# Altium schematic symbol library TI Power Management Shunt Voltage Reference.SchLib: 1526 symbols (part 6 of 18)
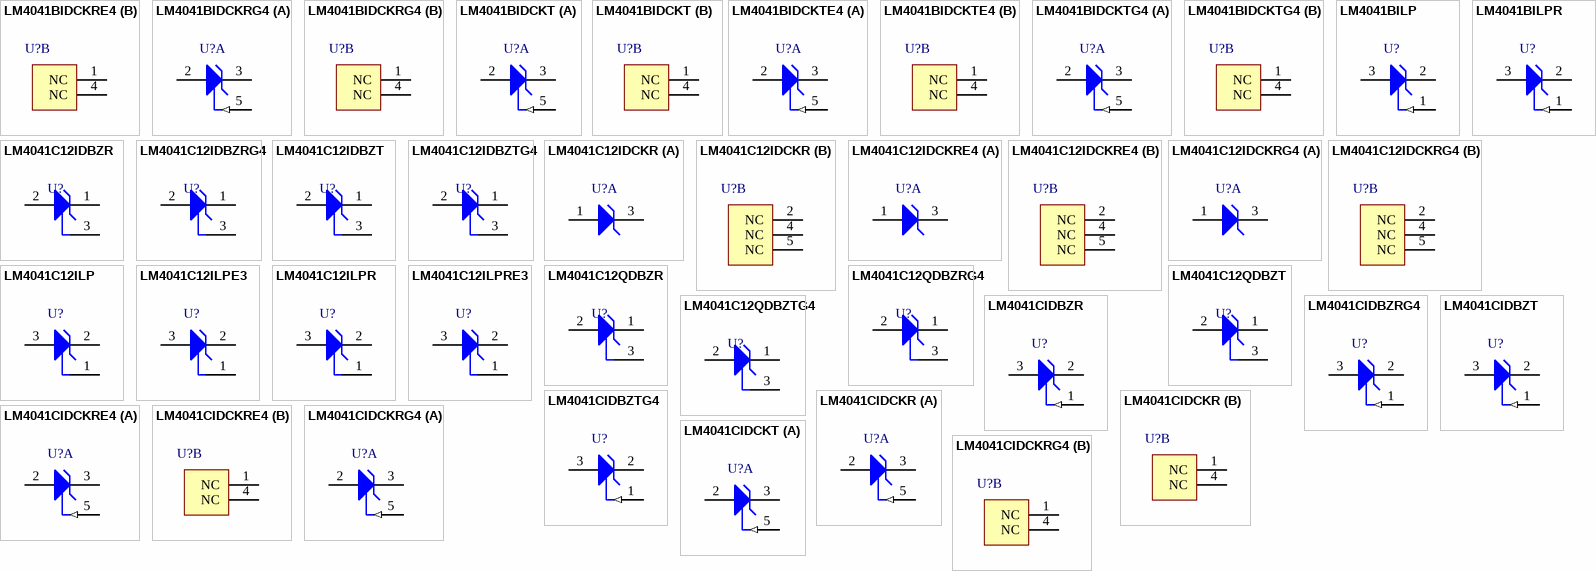
[diagram p62: symbols LM4041BIDCKRE4 to LM4041CIDCKT]

## LM4041C12IDCKRE4
designator U?
Precision Micropower Shunt Voltage Reference, 0.5% accuracy, 1.2 V, 15 ppm / degC, 12 mA, -40 to 85 degC, 5-pin SC70 (DCK), Green (RoHS & no Sb/Br); Manufacturer: Texas Instruments; PartNumber: LM4041C12IDCKRE4; Initial Accuracy @ 25/deg C(%): 0.5; Iout/Iz(Max)(mA): 12; Min Iz for Regulation(uA): 60; Rating: Catalog; Temp Coeff(Max)(ppm/ degree C): 100; Temp Coeff(Typ)(ppm/ degree C): 15; VO(V): 1.225; DatasheetVersion: SLCS146E; PackageReference: DCK5; PackageDescription: 5-Pin Plastic Small-Outline Package, 2 x 1.3 mm Body, 0.65 mm Pitch, 2.1 mm Lead Span; Supplier 1: Digi-Key; Supplier Part Number 1: LM4041C12IDCKRE4-ND; Supplier 2: Mouser; Supplier Part Number 2: 595-LM4041C12IDCKRE4; Eco-Plan: Green (RoHS & no Sb/Br); SubFamily: Shunt Voltage Reference; Mounting Technology: Surface Mount; Code_JEDEC: MO-203; ComponentLink1Description: Manufacturer URL; ComponentLink1URL: http://www.ti.com/; ComponentLink2Description: Datasheet; ComponentLink2URL: http://www.ti.com/general/docs/lit/getliterature.tsp?genericPartNumber=LM4041C12&fileType=pdf; ComponentLink3Description: Package Specification; ComponentLink3URL: http://www.ti.com/litv/pdf/mpds025f; ComponentLink4Description: URL Link1; ComponentLink4URL: Samples URL:http://www.ti.com/product/lm4041c12
footprint TI-DCK5_N (SOT353, 5-Leads, Body 2x1.3mm, Pitch 0.65mm, Lead Span 2.1mm, IPC Medium Density)
part A pins: 1 ANODE, 3 CATHODE
part B pins: 2 NC, 4 NC, 5 NC

## LM4041C12IDCKRG4
designator U?
Precision Micropower Shunt Voltage Reference, 0.5% accuracy, 1.2 V, 15 ppm / degC, 12 mA, -40 to 85 degC, 5-pin SC70 (DCK), Green (RoHS & no Sb/Br); Manufacturer: Texas Instruments; PartNumber: LM4041C12IDCKRG4; Initial Accuracy @ 25/deg C(%): 0.5; Iout/Iz(Max)(mA): 12; Min Iz for Regulation(uA): 60; Rating: Catalog; Temp Coeff(Max)(ppm/ degree C): 100; Temp Coeff(Typ)(ppm/ degree C): 15; VO(V): 1.225; DatasheetVersion: SLCS146E; PackageReference: DCK5; PackageDescription: 5-Pin Plastic Small-Outline Package, 2 x 1.3 mm Body, 0.65 mm Pitch, 2.1 mm Lead Span; Supplier 1: Digi-Key; Supplier Part Number 1: LM4041C12IDCKRG4-ND; Supplier 2: Newark; Supplier Part Number 2: 41M3460; Supplier 3: Mouser; Supplier Part Number 3: 595-LM4041C12IDCKRG4; Eco-Plan: Green (RoHS & no Sb/Br); SubFamily: Shunt Voltage Reference; Mounting Technology: Surface Mount; Code_JEDEC: MO-203; ComponentLink1Description: Manufacturer URL; ComponentLink1URL: http://www.ti.com/; ComponentLink2Description: Datasheet; ComponentLink2URL: http://www.ti.com/general/docs/lit/getliterature.tsp?genericPartNumber=LM4041C12&fileType=pdf; ComponentLink3Description: Package Specification; ComponentLink3URL: http://www.ti.com/litv/pdf/mpds025f; ComponentLink4Description: URL Link1; ComponentLink4URL: Samples URL:http://www.ti.com/product/lm4041c12
footprint TI-DCK5_N (SOT353, 5-Leads, Body 2x1.3mm, Pitch 0.65mm, Lead Span 2.1mm, IPC Medium Density)
part A pins: 1 ANODE, 3 CATHODE
part B pins: 2 NC, 4 NC, 5 NC

## LM4041C12ILP
designator U?
Precision Micropower Shunt Voltage Reference, 0.5% accuracy, 1.225 V, 15 ppm / degC, 12 mA, -40 to 85 degC, 3-pin TO-92(LP), Pb-Free (RoHS); Manufacturer: Texas Instruments; PartNumber: LM4041C12ILP; Initial Accuracy @ 25/deg C(%): 0.5; Iout/Iz(Max)(mA): 12; Min Iz for Regulation(uA): 60; Rating: Catalog; Temp Coeff(Max)(ppm/ degree C): 100; Temp Coeff(Typ)(ppm/ degree C): 15; VO(V): 1.225; DatasheetVersion: SLCS146E; PackageVersion: 4040001-2/C; PackageReference: LP3; PackageDescription: Plastic Cylindrical Package, Formed Lead Option (TO-92); Supplier 1: Digi-Key; Supplier Part Number 1: 296-31373-ND; Supplier 2: Newark; Supplier Part Number 2: 18M2429; Supplier 3: Mouser; Supplier Part Number 3: 595-LM4041C12ILP; Eco-Plan: Pb-Free (RoHS); SubFamily: Shunt Voltage Reference; Mounting Technology: Through Hole; Code_JEDEC: TO-226; ComponentLink1Description: Manufacturer URL; ComponentLink1URL: http://www.ti.com/; ComponentLink2Description: Datasheet; ComponentLink2URL: http://www.ti.com/general/docs/lit/getliterature.tsp?genericPartNumber=LM4041C12&fileType=pdf; ComponentLink3Description: Package Specification; ComponentLink3URL: http://www.ti.com/litv/pdf/msot002a; ComponentLink4Description: URL Link1; ComponentLink4URL: Samples URL:http://www.ti.com/product/lm4041c12
footprint TI-LP3 (TO, Flat Index; 3 In-Line, Formed Axial Leads; Body Dia. 4.8mm; Leads 0.56 x 0.41 mm (max))
pins: 1 NC, 2 CATHODE, 3 ANODE

## LM4041C12ILPE3
designator U?
Precision Micropower Shunt Voltage Reference, 0.5% accuracy, 1.225 V, 15 ppm / degC, 12 mA, -40 to 85 degC, 3-pin TO-92(LP), Pb-Free (RoHS); Manufacturer: Texas Instruments; PartNumber: LM4041C12ILPE3; Initial Accuracy @ 25/deg C(%): 0.5; Iout/Iz(Max)(mA): 12; Min Iz for Regulation(uA): 60; Rating: Catalog; Temp Coeff(Max)(ppm/ degree C): 100; Temp Coeff(Typ)(ppm/ degree C): 15; VO(V): 1.225; DatasheetVersion: SLCS146E; PackageVersion: 4040001-2/C; PackageReference: LP3; PackageDescription: Plastic Cylindrical Package, Formed Lead Option (TO-92); Supplier 1: Digi-Key; Supplier Part Number 1: LM4041C12ILPE3-ND; Supplier 2: Newark; Supplier Part Number 2: 65M1448; Supplier 3: Mouser; Supplier Part Number 3: 595-LM4041C12ILPE3; Eco-Plan: Pb-Free (RoHS); SubFamily: Shunt Voltage Reference; Mounting Technology: Through Hole; Code_JEDEC: TO-226; ComponentLink1Description: Manufacturer URL; ComponentLink1URL: http://www.ti.com/; ComponentLink2Description: Datasheet; ComponentLink2URL: http://www.ti.com/general/docs/lit/getliterature.tsp?genericPartNumber=LM4041C12&fileType=pdf; ComponentLink3Description: Package Specification; ComponentLink3URL: http://www.ti.com/litv/pdf/msot002a; ComponentLink4Description: URL Link1; ComponentLink4URL: Samples URL:http://www.ti.com/product/lm4041c12
footprint TI-LP3 (TO, Flat Index; 3 In-Line, Formed Axial Leads; Body Dia. 4.8mm; Leads 0.56 x 0.41 mm (max))
pins: 1 NC, 2 CATHODE, 3 ANODE

## LM4041C12ILPR
designator U?
Precision Micropower Shunt Voltage Reference, 0.5% accuracy, 1.225 V, 15 ppm / degC, 12 mA, -40 to 85 degC, 3-pin TO-92(LP), Pb-Free (RoHS); Manufacturer: Texas Instruments; PartNumber: LM4041C12ILPR; Initial Accuracy @ 25/deg C(%): 0.5; Iout/Iz(Max)(mA): 12; Min Iz for Regulation(uA): 60; Rating: Catalog; Temp Coeff(Max)(ppm/ degree C): 100; Temp Coeff(Typ)(ppm/ degree C): 15; VO(V): 1.225; DatasheetVersion: SLCS146E; PackageVersion: 4040001-2/C; PackageReference: LP3; PackageDescription: Plastic Cylindrical Package, Formed Lead Option (TO-92); Supplier 1: Digi-Key; Supplier Part Number 1: 296-20747-3-ND; Supplier 2: Digi-Key; Supplier Part Number 2: 296-20747-1-ND; Supplier 3: Newark; Supplier Part Number 3: 18M2430; Supplier 4: Mouser; Supplier Part Number 4: 595-LM4041C12ILPR; Eco-Plan: Pb-Free (RoHS); SubFamily: Shunt Voltage Reference; Mounting Technology: Through Hole; Code_JEDEC: TO-226; ComponentLink1Description: Manufacturer URL; ComponentLink1URL: http://www.ti.com/; ComponentLink2Description: Datasheet; ComponentLink2URL: http://www.ti.com/general/docs/lit/getliterature.tsp?genericPartNumber=LM4041C12&fileType=pdf; ComponentLink3Description: Package Specification; ComponentLink3URL: http://www.ti.com/litv/pdf/msot002a; ComponentLink4Description: URL Link1; ComponentLink4URL: Samples URL:http://www.ti.com/product/lm4041c12
footprint TI-LP3 (TO, Flat Index; 3 In-Line, Formed Axial Leads; Body Dia. 4.8mm; Leads 0.56 x 0.41 mm (max))
pins: 1 NC, 2 CATHODE, 3 ANODE

## LM4041C12ILPRE3
designator U?
Precision Micropower Shunt Voltage Reference, 0.5% accuracy, 1.225 V, 15 ppm / degC, 12 mA, -40 to 85 degC, 3-pin TO-92(LP), Pb-Free (RoHS); Manufacturer: Texas Instruments; PartNumber: LM4041C12ILPRE3; Initial Accuracy @ 25/deg C(%): 0.5; Iout/Iz(Max)(mA): 12; Min Iz for Regulation(uA): 60; Rating: Catalog; Temp Coeff(Max)(ppm/ degree C): 100; Temp Coeff(Typ)(ppm/ degree C): 15; VO(V): 1.225; DatasheetVersion: SLCS146E; PackageVersion: 4040001-2/C; PackageReference: LP3; PackageDescription: Plastic Cylindrical Package, Formed Lead Option (TO-92); Supplier 1: Digi-Key; Supplier Part Number 1: LM4041C12ILPRE3-ND; Supplier 2: Newark; Supplier Part Number 2: 65M1449; Supplier 3: Mouser; Supplier Part Number 3: 595-LM4041C12ILPRE3; Eco-Plan: Pb-Free (RoHS); SubFamily: Shunt Voltage Reference; Mounting Technology: Through Hole; Code_JEDEC: TO-226; ComponentLink1Description: Manufacturer URL; ComponentLink1URL: http://www.ti.com/; ComponentLink2Description: Datasheet; ComponentLink2URL: http://www.ti.com/general/docs/lit/getliterature.tsp?genericPartNumber=LM4041C12&fileType=pdf; ComponentLink3Description: Package Specification; ComponentLink3URL: http://www.ti.com/litv/pdf/msot002a; ComponentLink4Description: URL Link1; ComponentLink4URL: Samples URL:http://www.ti.com/product/lm4041c12
footprint TI-LP3 (TO, Flat Index; 3 In-Line, Formed Axial Leads; Body Dia. 4.8mm; Leads 0.56 x 0.41 mm (max))
pins: 1 NC, 2 CATHODE, 3 ANODE

## LM4041C12QDBZR
designator U?
1.2-V Precision Micropower Shunt Voltage Reference, 0.5% accuracy, 15 ppm / degC, 12 mA, -40 to 125 degC, 3-pin SOT-23 (DBZ), Green (RoHS & no Sb/Br); Manufacturer: Texas Instruments; PartNumber: LM4041C12QDBZR; Initial Accuracy @ 25/deg C(%): 0.5; Iout/Iz(Max)(mA): 12; Min Iz for Regulation(uA): 60; Rating: Catalog; Temp Coeff(Max)(ppm/ degree C): 100; Temp Coeff(Typ)(ppm/ degree C): 15; VO(V): 1.225; DatasheetVersion: SLCS146E; PackageVersion: 4203227/B; PackageReference: DBZ3; PackageDescription: 3-Pin Plastic Small Outline, Body 2.92 x 1.3 mm, Pitch 0.95 mm; Supplier 1: Digi-Key; Supplier Part Number 1: 296-20918-2-ND; Supplier 2: Digi-Key; Supplier Part Number 2: 296-20918-1-ND; Supplier 3: Digi-Key; Supplier Part Number 3: 296-20918-6-ND; Supplier 4: Newark; Supplier Part Number 4: 43K3375; Supplier 5: Mouser; Supplier Part Number 5: 595-LM4041C12QDBZR; Eco-Plan: Green (RoHS & no Sb/Br); SubFamily: Shunt Voltage Reference; Mounting Technology: Surface Mount; Code_JEDEC: TO-236; ComponentLink1Description: Manufacturer URL; ComponentLink1URL: http://www.ti.com/; ComponentLink2Description: Datasheet; ComponentLink2URL: http://www.ti.com/general/docs/lit/getliterature.tsp?genericPartNumber=LM4041C12&fileType=pdf; ComponentLink3Description: Package Specification; ComponentLink3URL: http://www.ti.com/litv/pdf/mpds108a
footprint TI-DBZ3_N (SOT23, 3-Leads, Body 2.92x1.3 mm, Pitch 0.95 mm, IPC Medium Density)
pins: 1 CATHODE, 2 ANODE, 3 NC

## LM4041C12QDBZRG4
designator U?
1.2-V Precision Micropower Shunt Voltage Reference, 0.5% accuracy, 15 ppm / degC, 12 mA, -40 to 125 degC, 3-pin SOT-23 (DBZ), Green (RoHS & no Sb/Br); Manufacturer: Texas Instruments; PartNumber: LM4041C12QDBZRG4; Initial Accuracy @ 25/deg C(%): 0.5; Iout/Iz(Max)(mA): 12; Min Iz for Regulation(uA): 60; Rating: Catalog; Temp Coeff(Max)(ppm/ degree C): 100; Temp Coeff(Typ)(ppm/ degree C): 15; VO(V): 1.225; DatasheetVersion: SLCS146E; PackageVersion: 4203227/B; PackageReference: DBZ3; PackageDescription: 3-Pin Plastic Small Outline, Body 2.92 x 1.3 mm, Pitch 0.95 mm; Supplier 1: Digi-Key; Supplier Part Number 1: LM4041C12QDBZRG4-ND; Supplier 2: Newark; Supplier Part Number 2: 52K5752; Supplier 3: Mouser; Supplier Part Number 3: 595-LM4041C12QDBZRG4; Eco-Plan: Green (RoHS & no Sb/Br); SubFamily: Shunt Voltage Reference; Mounting Technology: Surface Mount; Code_JEDEC: TO-236; ComponentLink1Description: Manufacturer URL; ComponentLink1URL: http://www.ti.com/; ComponentLink2Description: Datasheet; ComponentLink2URL: http://www.ti.com/general/docs/lit/getliterature.tsp?genericPartNumber=LM4041C12&fileType=pdf; ComponentLink3Description: Package Specification; ComponentLink3URL: http://www.ti.com/litv/pdf/mpds108a
footprint TI-DBZ3_N (SOT23, 3-Leads, Body 2.92x1.3 mm, Pitch 0.95 mm, IPC Medium Density)
pins: 1 CATHODE, 2 ANODE, 3 NC

## LM4041C12QDBZT
designator U?
1.2-V Precision Micropower Shunt Voltage Reference, 0.5% accuracy, 15 ppm / degC, 12 mA, -40 to 125 degC, 3-pin SOT-23 (DBZ), Green (RoHS & no Sb/Br); Manufacturer: Texas Instruments; PartNumber: LM4041C12QDBZT; Initial Accuracy @ 25/deg C(%): 0.5; Iout/Iz(Max)(mA): 12; Min Iz for Regulation(uA): 60; Rating: Catalog; Temp Coeff(Max)(ppm/ degree C): 100; Temp Coeff(Typ)(ppm/ degree C): 15; VO(V): 1.225; DatasheetVersion: SLCS146E; PackageVersion: 4203227/B; PackageReference: DBZ3; PackageDescription: 3-Pin Plastic Small Outline, Body 2.92 x 1.3 mm, Pitch 0.95 mm; Supplier 1: Digi-Key; Supplier Part Number 1: 296-32128-2-ND; Supplier 2: Digi-Key; Supplier Part Number 2: 296-32128-1-ND; Supplier 3: Digi-Key; Supplier Part Number 3: 296-32128-6-ND; Supplier 4: Newark; Supplier Part Number 4: 43K3376; Supplier 5: Mouser; Supplier Part Number 5: 595-LM4041C12QDBZT; Eco-Plan: Green (RoHS & no Sb/Br); SubFamily: Shunt Voltage Reference; Mounting Technology: Surface Mount; Code_JEDEC: TO-236; ComponentLink1Description: Manufacturer URL; ComponentLink1URL: http://www.ti.com/; ComponentLink2Description: Datasheet; ComponentLink2URL: http://www.ti.com/general/docs/lit/getliterature.tsp?genericPartNumber=LM4041C12&fileType=pdf; ComponentLink3Description: Package Specification; ComponentLink3URL: http://www.ti.com/litv/pdf/mpds108a
footprint TI-DBZ3_N (SOT23, 3-Leads, Body 2.92x1.3 mm, Pitch 0.95 mm, IPC Medium Density)
pins: 1 CATHODE, 2 ANODE, 3 NC

## LM4041C12QDBZTG4
designator U?
1.2-V Precision Micropower Shunt Voltage Reference, 0.5% accuracy, 15 ppm / degC, 12 mA, -40 to 125 degC, 3-pin SOT-23 (DBZ), Green (RoHS & no Sb/Br); Manufacturer: Texas Instruments; PartNumber: LM4041C12QDBZTG4; Initial Accuracy @ 25/deg C(%): 0.5; Iout/Iz(Max)(mA): 12; Min Iz for Regulation(uA): 60; Rating: Catalog; Temp Coeff(Max)(ppm/ degree C): 100; Temp Coeff(Typ)(ppm/ degree C): 15; VO(V): 1.2; DatasheetVersion: SLCS146E; PackageVersion: 4203227/B; PackageReference: DBZ3; PackageDescription: 3-Pin Plastic Small Outline, Body 2.92 x 1.3 mm, Pitch 0.95 mm; Supplier 1: Digi-Key; Supplier Part Number 1: LM4041C12QDBZTG4-ND; Supplier 2: Mouser; Supplier Part Number 2: 595-LM4041C12QDBZTG4; Eco-Plan: Green (RoHS & no Sb/Br); SubFamily: Shunt Voltage Reference; Mounting Technology: Surface Mount; Code_JEDEC: TO-236; ComponentLink1Description: Manufacturer URL; ComponentLink1URL: http://www.ti.com/; ComponentLink2Description: Datasheet; ComponentLink2URL: http://www.ti.com/general/docs/lit/getliterature.tsp?genericPartNumber=LM4041C12&fileType=pdf; ComponentLink3Description: Package Specification; ComponentLink3URL: http://www.ti.com/litv/pdf/mpds108a
footprint TI-DBZ3_N (SOT23, 3-Leads, Body 2.92x1.3 mm, Pitch 0.95 mm, IPC Medium Density)
pins: 1 CATHODE, 2 ANODE, 3 NC

## LM4041CIDBZR
designator U?
Adjustable Precision Micropower Shunt Voltage Reference, 0.5% accuracy, 15 ppm / degC, 12 mA, -40 to 85 degC, 3-pin SOT-23 (DBZ), Green (RoHS & no Sb/Br); Manufacturer: Texas Instruments; PartNumber: LM4041CIDBZR; Initial Accuracy @ 25/deg C(%): 0.5; Iout/Iz(Max)(mA): 12; Min Iz for Regulation(uA): 60; Rating: Catalog; Temp Coeff(Max)(ppm/ degree C): 100; Temp Coeff(Typ)(ppm/ degree C): 15; VO Adj(Min)(V): 1.225; DatasheetVersion: SLCS146E; PackageVersion: 4203227/B; PackageReference: DBZ3; PackageDescription: 3-Pin Plastic Small Outline, Body 2.92 x 1.3 mm, Pitch 0.95 mm; Supplier 1: Digi-Key; Supplier Part Number 1: 296-17943-2-ND; Supplier 2: Digi-Key; Supplier Part Number 2: 296-17943-1-ND; Supplier 3: Digi-Key; Supplier Part Number 3: 296-17943-6-ND; Supplier 4: Newark; Supplier Part Number 4: 31K7136; Supplier 5: Mouser; Supplier Part Number 5: 595-LM4041CIDBZR; Eco-Plan: Green (RoHS & no Sb/Br); SubFamily: Shunt Voltage Reference; VO Adj(Max)(V): 15; Mounting Technology: Surface Mount; Code_JEDEC: TO-236; ComponentLink1Description: Manufacturer URL; ComponentLink1URL: http://www.ti.com/; ComponentLink2Description: Datasheet; ComponentLink2URL: http://www.ti.com/general/docs/lit/getliterature.tsp?genericPartNumber=LM4041C&fileType=pdf; ComponentLink3Description: Package Specification; ComponentLink3URL: http://www.ti.com/litv/pdf/mpds108a
footprint TI-DBZ3_N (SOT23, 3-Leads, Body 2.92x1.3 mm, Pitch 0.95 mm, IPC Medium Density)
pins: 1 FB (in), 2 CATHODE, 3 ANODE

## LM4041CIDBZRG4
designator U?
Adjustable Precision Micropower Shunt Voltage Reference, 0.5% accuracy, 15 ppm / degC, 12 mA, -40 to 85 degC, 3-pin SOT-23 (DBZ), Green (RoHS & no Sb/Br); Manufacturer: Texas Instruments; PartNumber: LM4041CIDBZRG4; Initial Accuracy @ 25/deg C(%): 0.5; Iout/Iz(Max)(mA): 12; Min Iz for Regulation(uA): 60; Rating: Catalog; Temp Coeff(Max)(ppm/ degree C): 100; Temp Coeff(Typ)(ppm/ degree C): 15; VO Adj(Min)(V): 1.225; DatasheetVersion: SLCS146E; PackageVersion: 4203227/B; PackageReference: DBZ3; PackageDescription: 3-Pin Plastic Small Outline, Body 2.92 x 1.3 mm, Pitch 0.95 mm; Supplier 1: Digi-Key; Supplier Part Number 1: LM4041CIDBZRG4-ND; Supplier 2: Mouser; Supplier Part Number 2: 595-LM4041CIDBZRG4; Eco-Plan: Green (RoHS & no Sb/Br); SubFamily: Shunt Voltage Reference; VO Adj(Max)(V): 15; Mounting Technology: Surface Mount; Code_JEDEC: TO-236; ComponentLink1Description: Manufacturer URL; ComponentLink1URL: http://www.ti.com/; ComponentLink2Description: Datasheet; ComponentLink2URL: http://www.ti.com/general/docs/lit/getliterature.tsp?genericPartNumber=LM4041C&fileType=pdf; ComponentLink3Description: Package Specification; ComponentLink3URL: http://www.ti.com/litv/pdf/mpds108a
footprint TI-DBZ3_N (SOT23, 3-Leads, Body 2.92x1.3 mm, Pitch 0.95 mm, IPC Medium Density)
pins: 1 FB (in), 2 CATHODE, 3 ANODE

## LM4041CIDBZT
designator U?
Adjustable Precision Micropower Shunt Voltage Reference, 0.5% accuracy, 15 ppm / degC, 12 mA, -40 to 85 degC, 3-pin SOT-23 (DBZ), Green (RoHS & no Sb/Br); Manufacturer: Texas Instruments; PartNumber: LM4041CIDBZT; Initial Accuracy @ 25/deg C(%): 0.5; Iout/Iz(Max)(mA): 12; Min Iz for Regulation(uA): 60; Rating: Catalog; Temp Coeff(Max)(ppm/ degree C): 100; Temp Coeff(Typ)(ppm/ degree C): 15; VO Adj(Min)(V): 1.225; DatasheetVersion: SLCS146E; PackageVersion: 4203227/B; PackageReference: DBZ3; PackageDescription: 3-Pin Plastic Small Outline, Body 2.92 x 1.3 mm, Pitch 0.95 mm; Supplier 1: Digi-Key; Supplier Part Number 1: 296-32129-2-ND; Supplier 2: Digi-Key; Supplier Part Number 2: 296-32129-1-ND; Supplier 3: Digi-Key; Supplier Part Number 3: 296-32129-6-ND; Supplier 4: Mouser; Supplier Part Number 4: 595-LM4041CIDBZT; Eco-Plan: Green (RoHS & no Sb/Br); SubFamily: Shunt Voltage Reference; VO Adj(Max)(V): 15; Mounting Technology: Surface Mount; Code_JEDEC: TO-236; ComponentLink1Description: Manufacturer URL; ComponentLink1URL: http://www.ti.com/; ComponentLink2Description: Datasheet; ComponentLink2URL: http://www.ti.com/general/docs/lit/getliterature.tsp?genericPartNumber=LM4041C&fileType=pdf; ComponentLink3Description: Package Specification; ComponentLink3URL: http://www.ti.com/litv/pdf/mpds108a
footprint TI-DBZ3_N (SOT23, 3-Leads, Body 2.92x1.3 mm, Pitch 0.95 mm, IPC Medium Density)
pins: 1 FB (in), 2 CATHODE, 3 ANODE

## LM4041CIDBZTG4
designator U?
Adjustable Precision Micropower Shunt Voltage Reference, 0.5% accuracy, 15 ppm / degC, 12 mA, -40 to 85 degC, 3-pin SOT-23 (DBZ), Green (RoHS & no Sb/Br); Manufacturer: Texas Instruments; PartNumber: LM4041CIDBZTG4; Initial Accuracy @ 25/deg C(%): 0.5; Iout/Iz(Max)(mA): 12; Min Iz for Regulation(uA): 60; Rating: Catalog; Temp Coeff(Max)(ppm/ degree C): 100; Temp Coeff(Typ)(ppm/ degree C): 15; VO Adj(Min)(V): 1.225; DatasheetVersion: SLCS146E; PackageVersion: 4203227/B; PackageReference: DBZ3; PackageDescription: 3-Pin Plastic Small Outline, Body 2.92 x 1.3 mm, Pitch 0.95 mm; Supplier 1: Digi-Key; Supplier Part Number 1: LM4041CIDBZTG4-ND; Supplier 2: Farnell; Supplier Part Number 2: 1053801; Supplier 3: Newark; Supplier Part Number 3: 97K3500; Supplier 4: Mouser; Supplier Part Number 4: 595-LM4041CIDBZTG4; Eco-Plan: Green (RoHS & no Sb/Br); SubFamily: Shunt Voltage Reference; VO Adj(Max)(V): 15; Mounting Technology: Surface Mount; Code_JEDEC: TO-236; ComponentLink1Description: Manufacturer URL; ComponentLink1URL: http://www.ti.com/; ComponentLink2Description: Datasheet; ComponentLink2URL: http://www.ti.com/general/docs/lit/getliterature.tsp?genericPartNumber=LM4041C&fileType=pdf; ComponentLink3Description: Package Specification; ComponentLink3URL: http://www.ti.com/litv/pdf/mpds108a
footprint TI-DBZ3_N (SOT23, 3-Leads, Body 2.92x1.3 mm, Pitch 0.95 mm, IPC Medium Density)
pins: 1 FB (in), 2 CATHODE, 3 ANODE

## LM4041CIDCKR
designator U?
Adjustable Precision Micropower Shunt Voltage Reference, 0.5% accuracy, 15 ppm / degC, 12 mA, -40 to 85 degC, 5-pin SC70 (DCK), Green (RoHS & no Sb/Br); Manufacturer: Texas Instruments; PartNumber: LM4041CIDCKR; Initial Accuracy @ 25/deg C(%): 0.5; Iout/Iz(Max)(mA): 12; Min Iz for Regulation(uA): 60; Rating: Catalog; Temp Coeff(Max)(ppm/ degree C): 100; Temp Coeff(Typ)(ppm/ degree C): 15; VO Adj(Min)(V): 1.225; DatasheetVersion: SLCS146E; PackageReference: DCK5; PackageDescription: 5-Pin Plastic Small-Outline Package, 2 x 1.3 mm Body, 0.65 mm Pitch, 2.1 mm Lead Span; Supplier 1: Digi-Key; Supplier Part Number 1: 296-17944-2-ND; Supplier 2: Digi-Key; Supplier Part Number 2: 296-17944-1-ND; Supplier 3: Digi-Key; Supplier Part Number 3: 296-17944-6-ND; Supplier 4: Mouser; Supplier Part Number 4: 595-LM4041CIDCKR; Eco-Plan: Green (RoHS & no Sb/Br); SubFamily: Shunt Voltage Reference; VO Adj(Max)(V): 15; Mounting Technology: Surface Mount; Code_JEDEC: MO-203; ComponentLink1Description: Manufacturer URL; ComponentLink1URL: http://www.ti.com/; ComponentLink2Description: Datasheet; ComponentLink2URL: http://www.ti.com/general/docs/lit/getliterature.tsp?genericPartNumber=LM4041C&fileType=pdf; ComponentLink3Description: Package Specification; ComponentLink3URL: http://www.ti.com/litv/pdf/mpds025f
footprint TI-DCK5_N (SOT353, 5-Leads, Body 2x1.3mm, Pitch 0.65mm, Lead Span 2.1mm, IPC Medium Density)
part A pins: 2 ANODE, 3 CATHODE, 5 FB (in)
part B pins: 1 NC "No internal connection", 4 NC "No internal connection"

## LM4041CIDCKRE4
designator U?
Adjustable Precision Micropower Shunt Voltage Reference, 0.5% accuracy, 15 ppm / degC, 12 mA, -40 to 85 degC, 5-pin SC70 (DCK), Green (RoHS & no Sb/Br); Manufacturer: Texas Instruments; PartNumber: LM4041CIDCKRE4; Initial Accuracy @ 25/deg C(%): 0.5; Iout/Iz(Max)(mA): 12; Min Iz for Regulation(uA): 60; Rating: Catalog; Temp Coeff(Max)(ppm/ degree C): 100; Temp Coeff(Typ)(ppm/ degree C): 15; VO Adj(Min)(V): 1.225; DatasheetVersion: SLCS146E; PackageReference: DCK5; PackageDescription: 5-Pin Plastic Small-Outline Package, 2 x 1.3 mm Body, 0.65 mm Pitch, 2.1 mm Lead Span; Supplier 1: Digi-Key; Supplier Part Number 1: LM4041CIDCKRE4-ND; Supplier 2: Mouser; Supplier Part Number 2: 595-LM4041CIDCKRE4; Eco-Plan: Green (RoHS & no Sb/Br); SubFamily: Shunt Voltage Reference; VO Adj(Max)(V): 15; Mounting Technology: Surface Mount; Code_JEDEC: MO-203; ComponentLink1Description: Manufacturer URL; ComponentLink1URL: http://www.ti.com/; ComponentLink2Description: Datasheet; ComponentLink2URL: http://www.ti.com/general/docs/lit/getliterature.tsp?genericPartNumber=LM4041C&fileType=pdf; ComponentLink3Description: Package Specification; ComponentLink3URL: http://www.ti.com/litv/pdf/mpds025f
footprint TI-DCK5_N (SOT353, 5-Leads, Body 2x1.3mm, Pitch 0.65mm, Lead Span 2.1mm, IPC Medium Density)
part A pins: 2 ANODE, 3 CATHODE, 5 FB (in)
part B pins: 1 NC "No internal connection", 4 NC "No internal connection"

## LM4041CIDCKRG4
designator U?
Adjustable Precision Micropower Shunt Voltage Reference, 0.5% accuracy, 15 ppm / degC, 12 mA, -40 to 85 degC, 5-pin SC70 (DCK), Green (RoHS & no Sb/Br); Manufacturer: Texas Instruments; PartNumber: LM4041CIDCKRG4; Initial Accuracy @ 25/deg C(%): 0.5; Iout/Iz(Max)(mA): 12; Min Iz for Regulation(uA): 60; Rating: Catalog; Temp Coeff(Max)(ppm/ degree C): 100; Temp Coeff(Typ)(ppm/ degree C): 15; VO Adj(Min)(V): 1.225; DatasheetVersion: SLCS146E; PackageReference: DCK5; PackageDescription: 5-Pin Plastic Small-Outline Package, 2 x 1.3 mm Body, 0.65 mm Pitch, 2.1 mm Lead Span; Supplier 1: Digi-Key; Supplier Part Number 1: LM4041CIDCKRG4-ND; Supplier 2: Mouser; Supplier Part Number 2: 595-LM4041CIDCKRG4; Eco-Plan: Green (RoHS & no Sb/Br); SubFamily: Shunt Voltage Reference; VO Adj(Max)(V): 15; Mounting Technology: Surface Mount; Code_JEDEC: MO-203; ComponentLink1Description: Manufacturer URL; ComponentLink1URL: http://www.ti.com/; ComponentLink2Description: Datasheet; ComponentLink2URL: http://www.ti.com/general/docs/lit/getliterature.tsp?genericPartNumber=LM4041C&fileType=pdf; ComponentLink3Description: Package Specification; ComponentLink3URL: http://www.ti.com/litv/pdf/mpds025f
footprint TI-DCK5_N (SOT353, 5-Leads, Body 2x1.3mm, Pitch 0.65mm, Lead Span 2.1mm, IPC Medium Density)
part A pins: 2 ANODE, 3 CATHODE, 5 FB (in)
part B pins: 1 NC "No internal connection", 4 NC "No internal connection"

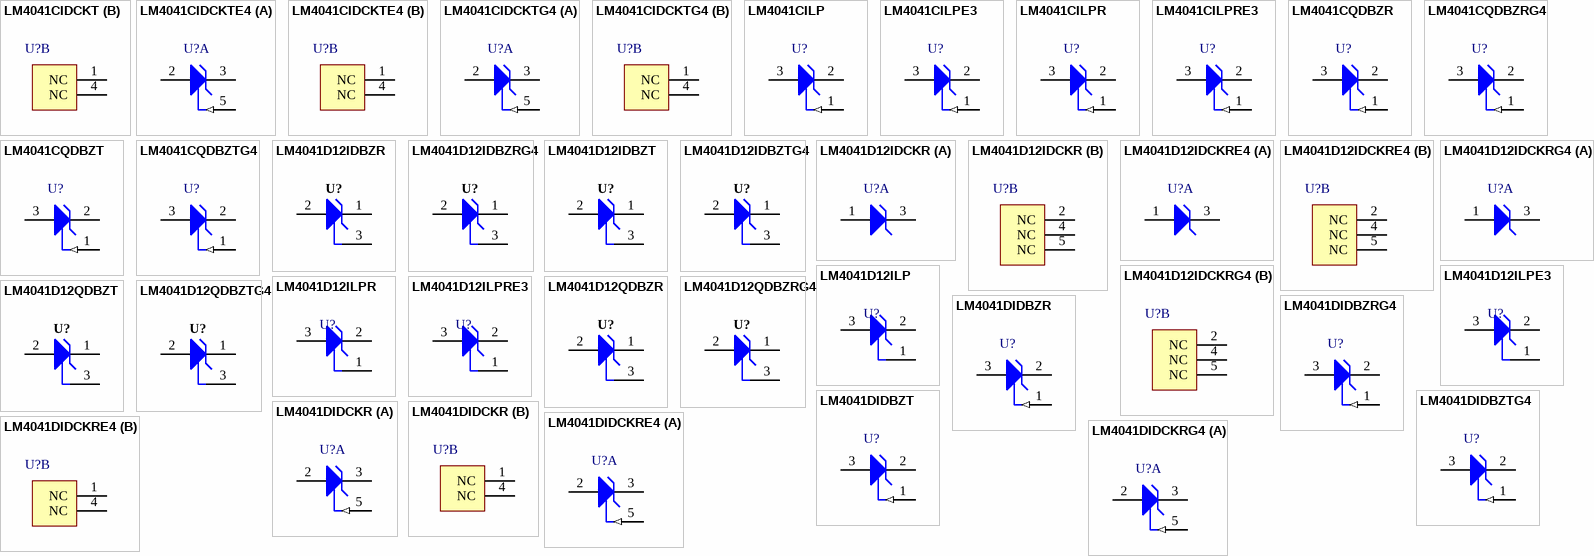
[diagram p16: symbols LM4041CIDCKT to LM4041DIDCKRG4]

## LM4041CIDCKT
designator U?
Adjustable Precision Micropower Shunt Voltage Reference, 0.5% accuracy, 15 ppm / degC, 12 mA, -40 to 85 degC, 5-pin SC70 (DCK), Green (RoHS & no Sb/Br); Manufacturer: Texas Instruments; PartNumber: LM4041CIDCKT; Initial Accuracy @ 25/deg C(%): 0.5; Iout/Iz(Max)(mA): 12; Min Iz for Regulation(uA): 60; Rating: Catalog; Temp Coeff(Max)(ppm/ degree C): 100; Temp Coeff(Typ)(ppm/ degree C): 15; VO Adj(Min)(V): 1.225; DatasheetVersion: SLCS146E; PackageReference: DCK5; PackageDescription: 5-Pin Plastic Small-Outline Package, 2 x 1.3 mm Body, 0.65 mm Pitch, 2.1 mm Lead Span; Supplier 1: Digi-Key; Supplier Part Number 1: 296-32130-2-ND; Supplier 2: Digi-Key; Supplier Part Number 2: 296-32130-1-ND; Supplier 3: Digi-Key; Supplier Part Number 3: 296-32130-6-ND; Supplier 4: Newark; Supplier Part Number 4: 31K7141; Supplier 5: Mouser; Supplier Part Number 5: 595-LM4041CIDCKT; Eco-Plan: Green (RoHS & no Sb/Br); SubFamily: Shunt Voltage Reference; VO Adj(Max)(V): 15; Mounting Technology: Surface Mount; Code_JEDEC: MO-203; ComponentLink1Description: Manufacturer URL; ComponentLink1URL: http://www.ti.com/; ComponentLink2Description: Datasheet; ComponentLink2URL: http://www.ti.com/general/docs/lit/getliterature.tsp?genericPartNumber=LM4041C&fileType=pdf; ComponentLink3Description: Package Specification; ComponentLink3URL: http://www.ti.com/litv/pdf/mpds025f
footprint TI-DCK5_N (SOT353, 5-Leads, Body 2x1.3mm, Pitch 0.65mm, Lead Span 2.1mm, IPC Medium Density)
part A pins: 2 ANODE, 3 CATHODE, 5 FB (in)
part B pins: 1 NC "No internal connection", 4 NC "No internal connection"

## LM4041CIDCKTE4
designator U?
Adjustable Precision Micropower Shunt Voltage Reference, 0.5% accuracy, 15 ppm / degC, 12 mA, -40 to 85 degC, 5-pin SC70 (DCK), Green (RoHS & no Sb/Br); Manufacturer: Texas Instruments; PartNumber: LM4041CIDCKTE4; Initial Accuracy @ 25/deg C(%): 0.5; Iout/Iz(Max)(mA): 12; Min Iz for Regulation(uA): 60; Rating: Catalog; Temp Coeff(Max)(ppm/ degree C): 100; Temp Coeff(Typ)(ppm/ degree C): 15; VO Adj(Max)(V): 10; VO Adj(Min)(V): 1.225; DatasheetVersion: SLCS146E; PackageReference: DCK5; PackageDescription: 5-Pin Plastic Small-Outline Package, 2 x 1.3 mm Body, 0.65 mm Pitch, 2.1 mm Lead Span; Supplier 1: Digi-Key; Supplier Part Number 1: LM4041CIDCKTE4-ND; Supplier 2: Farnell; Supplier Part Number 2: 1053797; Supplier 3: Mouser; Supplier Part Number 3: 595-LM4041CIDCKTE4; Eco-Plan: Green (RoHS & no Sb/Br); SubFamily: Shunt Voltage Reference; Mounting Technology: Surface Mount; Code_JEDEC: MO-203; ComponentLink1Description: Manufacturer URL; ComponentLink1URL: http://www.ti.com/; ComponentLink2Description: Datasheet; ComponentLink2URL: http://www.ti.com/general/docs/lit/getliterature.tsp?genericPartNumber=LM4041C&fileType=pdf; ComponentLink3Description: Package Specification; ComponentLink3URL: http://www.ti.com/litv/pdf/mpds025f
footprint TI-DCK5_N (SOT353, 5-Leads, Body 2x1.3mm, Pitch 0.65mm, Lead Span 2.1mm, IPC Medium Density)
part A pins: 2 ANODE, 3 CATHODE, 5 FB (in)
part B pins: 1 NC "No internal connection", 4 NC "No internal connection"
